# Altium footprint library Nanjar's Library.PcbLib: 153 footprints (part 3 of 10)
Each footprint in its own frame and in the unit in brackets; x right, y up, seen from the top. Pads: shape width x height; smd on the part's side, far side on the other; paste and mask are expansions set on the pad; w line width, h text height; cw(c..) or ccw(c..) is an arc to the next point about the centre after c.
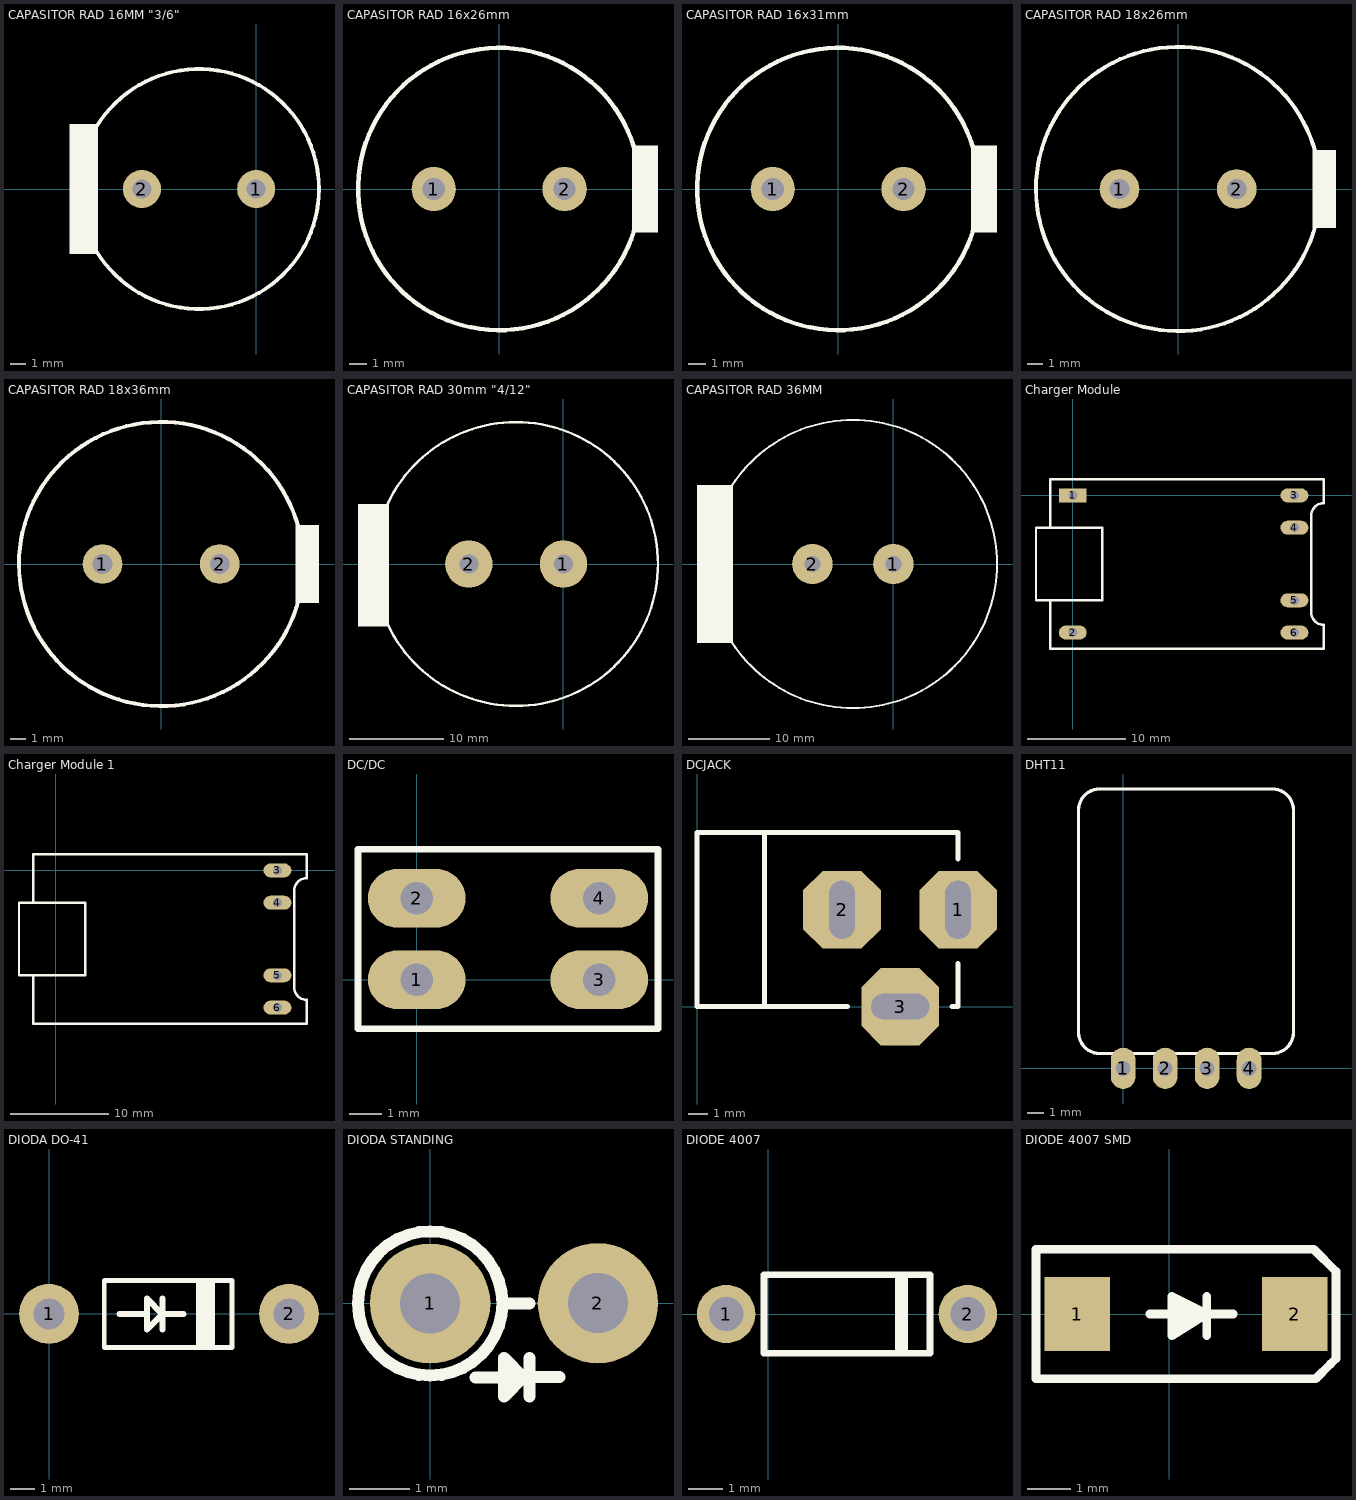
[diagram p2: the footprints below, top view; thin cyan lines are the x and y axes]

## CAPASITOR RAD 16MM "3/6" [mm]
height 1.4
pads (2):
  round 2.54 hole 1.27: 1(0,0) 2(-7.62,0)
Top Overlay:
  circle w0.254: c-3.81,0 r8
  region: -10.541,-4.318 -10.541,4.318 -12.446,4.318 -12.446,-4.318
3D body: height 20.01, standoff 1.38, extent -11.432,-5.146 -8.283,5.098
3D body: height 20.01, standoff 1.39, extent -9.809,-5.999 2.189,5.999
3D body: height 20, standoff 1.4, extent -11.429,-7.619 3.809,7.619

## CAPASITOR RAD 16x26mm [mm]
pads (2):
  round 2.54 hole 1.27: 1(-3.75,0) 2(3.75,0)
Top Overlay:
  rectangle: 7.6,-2.5 9.1,2.5
  lines w0.254: 6.899,4.225 ccw(c0,0) 6.899,4.224
3D body "User Library-Cap-EL(16x31_5-7_5)T.step": height 41, standoff -3, extent -8,-7.998 8.002,7.998

## CAPASITOR RAD 16x31mm [mm]
pads (2):
  round 2.54 hole 1.27: 1(-3.75,0) 2(3.75,0)
Top Overlay:
  rectangle: 7.6,-2.5 9.1,2.5
  lines w0.254: 6.899,4.225 ccw(c0,0) 6.899,4.224
3D body "User Library-Cap-EL(16x26-7_5).step": height 26, standoff -4.3, extent -8,-7.998 8.002,7.998

## CAPASITOR RAD 18x26mm [mm]
pads (2):
  round 2.54 hole 1.27: 1(-3.75,0) 2(3.75,0)
Top Overlay:
  rectangle: 8.6,-2.5 10.1,2.5
  lines w0.254: 7.752,4.747 ccw(c0,0) 7.752,4.747
3D body "User Library-Cap-EL(18x36-7_5)T.step": height 37, standoff -3, extent -9,-9 9.001,9

## CAPASITOR RAD 18x36mm [mm]
pads (2):
  round 2.54 hole 1.27: 1(-3.75,0) 2(3.75,0)
Top Overlay:
  rectangle: 8.6,-2.5 10.1,2.5
  lines w0.254: 7.752,4.747 ccw(c0,0) 7.752,4.747
3D body "User Library-Cap-EL(18x36-7_5)T.step": height 37, standoff -3, extent -9,-9 9.001,9

## CAPASITOR RAD 30mm "4/12" [mm]
pads (2):
  round 5 hole 2: 1(0,0) 2(-10,0)
Top Overlay:
  circle w0.254: c-5,0 r15
  rectangle: -21.714,-6.633 -18.412,6.367
3D body: height 20, standoff -0.1, extent -16.018,-11.018 6.017,11.017
3D body: height 30.1, standoff 2, extent -16.018,-11.018 6.017,11.017
3D body: height 30.1, standoff -0.1, extent -20.011,-8.772 -14.373,8.017
3D body: height 30, standoff 0, extent -19.999,-14.999 9.999,14.999
3D body: height 17, standoff -3, extent -0.794,-0.798 0.8,0.799
3D body: height 17, standoff -3, extent -10.794,-0.798 -9.2,0.799

## CAPASITOR RAD 36MM [mm]
pads (2):
  round 5 hole 2: 1(0,0) 2(-10,0)
Top Overlay:
  circle w0.254: c-5,0 r17.8
  rectangle: -24.257,-9.749 -19.812,9.751
3D body: height 5.05, standoff 1.95, extent -22.636,-4.251 -16,4.421
3D body: height 57.05, standoff 7.95, extent -22.636,-4.251 -16,4.421
3D body: height 8, standoff 5, extent -21.866,-16.998 12,16.935
3D body: height 2, standoff -2, extent -0.992,-0.998 1,0.998
3D body: height 2, standoff -2, extent -10.992,-0.998 -9,0.998
3D body: height 5, standoff 2, extent -22.362,-17.5 12.5,17.431
3D body: height 57, standoff 8, extent -22.362,-17.5 12.5,17.431

## Charger Module [mil]
pads (6):
  rect 112x56 hole 36: 1(0,0)
  oval 112x56 hole 36: 2(0,-551.18) 3(889.76,0) 4(889.76,-129.92) 5(889.76,-421.26) 6(889.76,-551.18)
Top Overlay:
  lines w10: -90.55,-421.26 -90.55,-616.14 1007.87,-616.14 1007.87,-519.15 1006.69,-519.15 cw(c1006.69,-469.15) 956.69,-469.15 956.69,-82.03 cw(c1006.69,-82.03) 1006.69,-32.03 1007.87,-32.03 ; -90.55,-421.26 118.11,-421.26 118.11,-129.92 -90.55,-129.92 ; -90.55,-421.26 -147.64,-421.26 -147.64,-129.92 -90.55,-129.92 ; -90.55,-129.92 -90.55,64.96 1007.87,64.96 1007.87,-32.03 ; 1007.87,-32.03 1007.87,-32.03
3D body "TP4056(03962A).STEP": height 144.41, standoff -3.63, extent -147.64,-616.14 1007.87,64.96
3D body: height 181.1, standoff -149.18, extent 893.7,122.05 893.7,122.05
3D body: height 181.1, standoff -149.18, extent 1118.11,-102.36 1118.11,-102.36

## Charger Module 1 [mil]
pads (4):
  oval 112x56 hole 36: 3(889.76,0) 4(889.76,-129.92) 5(889.76,-421.26) 6(889.76,-551.18)
Top Overlay:
  lines w10: -90.55,-421.26 -147.64,-421.26 -147.64,-129.92 -90.55,-129.92 ; -90.55,-421.26 118.11,-421.26 118.11,-129.92 -90.55,-129.92 ; -90.55,-421.26 -90.55,-616.14 1007.87,-616.14 1007.87,-519.15 1006.69,-519.15 cw(c1006.69,-469.15) 956.69,-469.15 956.69,-82.03 cw(c1006.69,-82.03) 1006.69,-32.03 1007.87,-32.03 ; -90.55,-129.92 -90.55,64.96 1007.87,64.96 1007.87,-32.03 ; 1007.87,-32.03 1007.87,-32.03
3D body: height 181.1, standoff -149.18, extent 1118.11,-102.36 1118.11,-102.36
3D body: height 181.1, standoff -149.18, extent 893.7,122.05 893.7,122.05
3D body "TP4056(03962A).STEP": height 144.41, standoff -3.63, extent -147.64,-616.14 1007.87,64.96

## DC/DC [mm]
pads (4):
  oval 3x1.8 hole 1: 1(0,0) 2(0,2.5) 3(5.6,0) 4(5.6,2.5)
Top Overlay:
  lines w0.2: -1.8,-1.5 -1.8,4 7.4,4 7.4,-1.5 -1.8,-1.5

## DCJACK [mil]
pads (3):
  oct 158x158 hole 52 slot 118.11 at 90 deg: 1(530.98,197) 2(294.98,197)
  oct 158x158 hole 52 slot 118.11 at 0 deg: 3(412.98,0)
Top Overlay:
  lines w10: 136.98,1 136.98,354 ; 305.98,0 -0.02,0 -0.02,354 136.98,354 ; 518.48,0 530.98,0 530.98,87.5 ; 530.98,300 530.98,354 136.98,354
3D body "power jack.STEP": height 437.01, standoff -161.42, extent -7.88,-7.87 566.93,362.2

## DHT11 [mm] "Humidity Sensor"
height 1.5
pads (4):
  oval 1.5x2.5 hole 0.9: 1(0,0) 2(2.54,0) 3(5.08,0) 4(7.62,0)
Top Overlay:
  lines w0.2: -2.7,2.17 ccw(c-1.43,2.17) -1.43,0.9 9.03,0.9 ccw(c9.03,2.17) 10.3,2.17 10.3,15.63 ccw(c9.03,15.63) 9.03,16.9 -1.43,16.9 ccw(c-1.43,15.63) -2.7,15.63 -2.7,2.17
3D body: height 5, standoff 0, extent -2.7,0.9 10.3,16.9
3D body: height 5.01, standoff 3, extent -2.72,5.45 -2.23,6.45
3D body: height 5.01, standoff 3, extent 9.85,5.45 10.34,6.45
3D body: height 5.01, standoff 3, extent 9.85,7.45 10.34,8.45
3D body: height 5.01, standoff 3, extent -2.72,7.45 -2.23,8.45
3D body: height 5.01, standoff 3, extent 9.85,9.45 10.34,10.45
3D body: height 5.01, standoff 3, extent -2.72,9.45 -2.23,10.45
3D body: height 5.01, standoff 3, extent 9.85,11.45 10.34,12.45
3D body: height 5.01, standoff 3, extent -2.72,11.45 -2.23,12.45
3D body: height 5.01, standoff 3, extent 9.85,13.45 10.34,14.45
3D body: height 5.01, standoff 3, extent -2.72,13.45 -2.23,14.45
3D body: height 5.01, standoff 3, extent 1.26,16.47 2.26,16.96
3D body: height 5.01, standoff 3, extent 3.26,16.47 4.26,16.96
3D body: height 5.01, standoff 3, extent 5.26,16.47 6.26,16.96
3D body: height 5.01, standoff 5, extent 1.3,13.45 2.3,14.45
3D body: height 5.01, standoff 5, extent 3.3,13.45 4.3,14.45
3D body: height 5.01, standoff 5, extent 5.3,13.45 6.3,14.45
3D body: height 5.01, standoff 5, extent -2.7,13.45 0.26,14.45
3D body: height 5.01, standoff 5, extent 7.36,13.45 10.32,14.45
3D body: height 5.01, standoff 5, extent 1.3,11.45 2.3,12.45
3D body: height 5.01, standoff 5, extent 3.3,11.45 4.3,12.45
3D body: height 5.01, standoff 5, extent 5.3,11.45 6.3,12.45
3D body: height 5.01, standoff 5, extent -2.7,11.45 0.26,12.45
3D body: height 5.01, standoff 5, extent 7.36,11.45 10.32,12.45
3D body: height 5.01, standoff 5, extent 1.3,9.45 2.3,10.45
3D body: height 5.01, standoff 5, extent 3.3,9.45 4.3,10.45
3D body: height 5.01, standoff 5, extent 5.3,9.45 6.3,10.45
3D body: height 5.01, standoff 5, extent -2.7,9.45 0.26,10.45
3D body: height 5.01, standoff 5, extent 7.36,9.45 10.32,10.45
3D body: height 5.01, standoff 5, extent 1.3,7.45 2.3,8.45
3D body: height 5.01, standoff 5, extent 3.3,7.45 4.3,8.45
3D body: height 5.01, standoff 5, extent 5.3,7.45 6.3,8.45
3D body: height 5.01, standoff 5, extent -2.7,7.45 0.26,8.45
3D body: height 5.01, standoff 5, extent 7.36,7.45 10.32,8.45
3D body: height 5.01, standoff 5, extent 7.36,5.45 10.32,6.45
3D body: height 5.01, standoff 5, extent -2.7,5.45 0.26,6.45
3D body: height 5.01, standoff 5, extent 5.3,5.45 6.3,6.45
3D body: height 5.01, standoff 5, extent 3.3,5.45 4.3,6.45
3D body: height 5.01, standoff 5, extent 1.3,5.45 2.3,6.45
3D body: height 5.01, standoff 5, extent 5.26,15.45 6.26,16.94
3D body: height 5.01, standoff 5, extent 3.26,15.45 4.26,16.94
3D body: height 5.01, standoff 5, extent 1.26,15.45 2.26,16.94
3D body: height 3.4, standoff 2.6, extent -0.4,0.002 0.397,15.002
3D body: height 3, standoff 0, extent -0.399,-0.398 0.398,0.4
3D body: height 3.4, standoff 2.6, extent -0.4,-0.397 0.396,0.4
3D body: height 3.4, standoff 2.6, extent 2.14,-0.397 2.936,0.4
3D body: height 3, standoff 0, extent 2.141,-0.398 2.938,0.4
3D body: height 3.4, standoff 2.6, extent 2.14,0.002 2.937,15.002
3D body: height 3.4, standoff 2.6, extent 4.68,-0.397 5.476,0.4
3D body: height 3, standoff 0, extent 4.681,-0.398 5.478,0.4
3D body: height 3.4, standoff 2.6, extent 4.68,0.002 5.477,15.002
3D body: height 3.4, standoff 2.6, extent 7.22,-0.397 8.016,0.4
3D body: height 3, standoff 0, extent 7.221,-0.398 8.018,0.4
3D body: height 3.4, standoff 2.6, extent 7.22,0.002 8.017,15.002

## DIODA DO-41 [mm] "DIODE AXIAL 5.2 X 2.7"
height 2.8
pads (2):
  round 2.5 hole 1.3: 1(0,0) 2(10,0)
Top Overlay:
  rectangle: 6.119,-1.4 6.919,1.4
  lines w0.2: 2.303,-1.403 2.303,1.397 7.62,1.397 7.62,-1.403 2.303,-1.403
  lines w0.254: 2.944,-0.003 4.005,-0.003 ; 4.722,-0.638 4.722,0.632 ; 5.611,-0.003 4.722,-0.003 ; 4.722,-0.003 4.087,0.632 4.087,-0.638 4.722,-0.003
3D body: height 1.9, standoff 1, extent -0.448,-0.449 0.448,0.447
3D body: height 1.45, standoff -3, extent -0.448,-0.449 0.448,0.449
3D body: height 1.9, standoff 1, extent 0,-0.449 5.667,0.449
3D body: height 2.84, standoff 0.05, extent 6.534,-1.397 7.559,1.397
3D body: height 2.79, standoff 0.1, extent 2.334,-1.347 7.534,1.347
3D body: height 1.9, standoff 1, extent 4.342,-0.449 10.009,0.449
3D body: height 1.45, standoff -3, extent 9.559,-0.449 10.456,0.449
3D body: height 1.9, standoff 1, extent 9.56,-0.447 10.455,0.449

## DIODA STANDING [mm] "DIODE AXIAL 5.2 X 2.7"
height 2.8
pads (2):
  round 2 hole 1: 1(0,0) 2(2.789,0.005)
Top Overlay:
  circle w0.2: c0,0 r1.2
  lines w0.2: 0.753,-1.228 1.55,-1.228 ; 1.2,0 1.65,0 ; 1.65,-1.547 1.65,-0.903 ; 1.65,-1.225 2.15,-1.225 ; 1.55,-1.228 1.228,-0.906 1.228,-1.55 1.55,-1.228
3D body "Diode.stp": height 6.75, standoff -2.8, extent -1.248,-1.24 2.789,1.25

## DIODE 4007 [mm] "DIODE 4002"
height 1.9
pads (2):
  round 1.7 hole 1: 1(-1.225,0) 2(5.8,0)
Top Overlay:
  rectangle: 3.683,-1.143 4.064,1.143
  lines w0.2: -0.127,-1.143 -0.127,1.143 4.699,1.143 4.699,-1.143 -0.127,-1.143
3D body "User Library-1N4007 x7mm.step": height 2.62, standoff -2.59, extent -1.614,-1.31 6.186,1.31

## DIODE 4007 SMD [mm]
pads (2):
  rect 1.5x1.7 smd: 1(-2.104,0) 2(2.866,0)
Top Overlay:
  region: 0.058,0.4 0.858,0 0.058,-0.5
  lines w0.2: -3.048,-1.481 -3.048,1.481 ; -0.442,0 1.458,0 ; 0.858,-0.5 0.858,0.4 ; 3.302,1.481 3.81,0.973 3.81,-1.016 3.683,-1.143 3.345,-1.481 ; 0.058,-0.5 0.058,0.4 0.858,0 0.058,-0.5
  lines w0.203: -3.048,-1.481 -2.794,-1.481 3.091,-1.481 3.345,-1.481 ; -3.048,1.481 -2.794,1.481 3.048,1.481 3.302,1.481
3D body "User Library-Diode Molded Body SMA.step": height 2.18, standoff -0.13, extent -2.017,-1.35 2.983,1.35